# Altium footprint library HubProModel_v1.PcbLib: 67 footprints (part 2 of 5)
Each footprint in its own frame and in the unit in brackets; x right, y up, seen from the top. Pads: shape width x height; smd on the part's side, far side on the other; paste and mask are expansions set on the pad; w line width, h text height; cw(c..) or ccw(c..) is an arc to the next point about the centre after c.
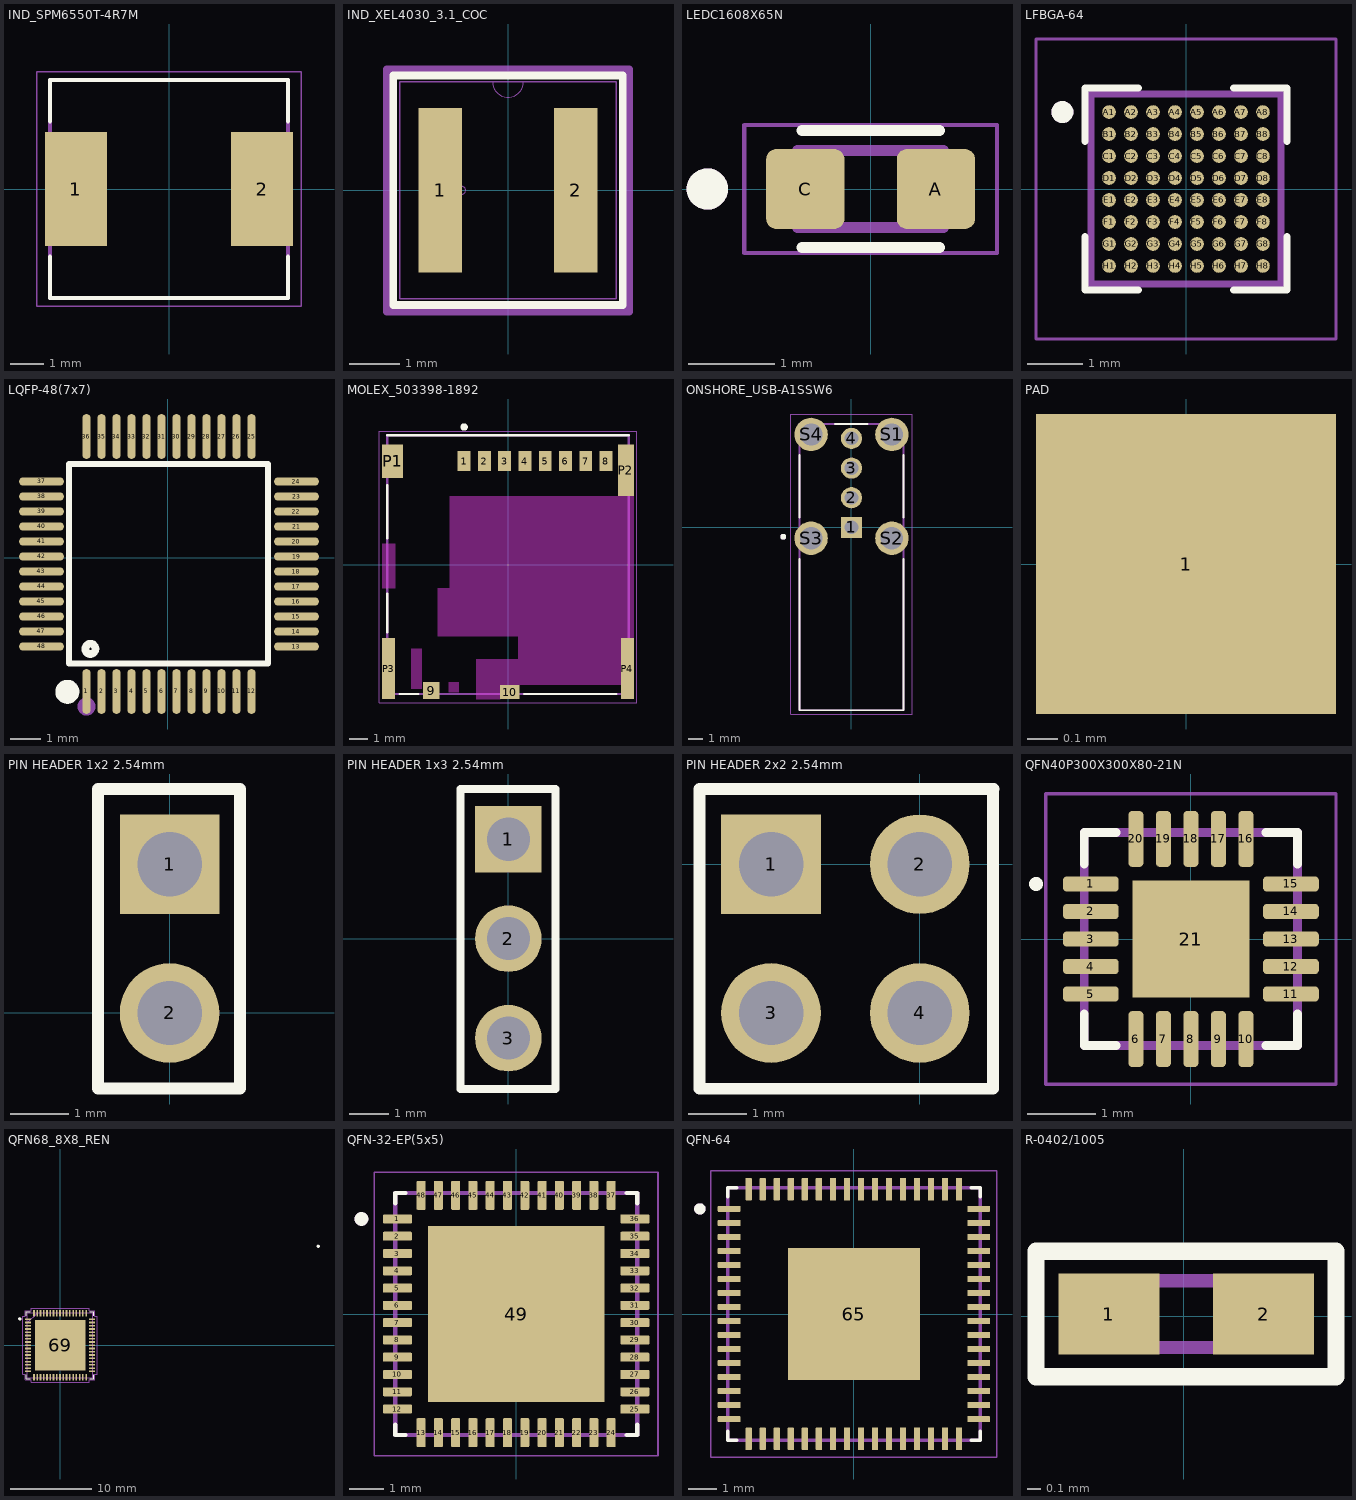
[diagram p1: the footprints below, top view; thin cyan lines are the x and y axes]

## IND_SPM6550T-4R7M [mm]
height 5
pads (2):
  rect 1.85x3.4 smd: 1(-2.775,0) 2(2.775,0)
Top Overlay:
  lines w0.127: -3.55,-2.02 -3.55,-3.25 3.55,-3.25 3.55,-2.02 ; -3.55,2.02 -3.55,3.25 3.55,3.25 3.55,2.02
Mechanical 13:
  lines w0.127: -3.55,-3.25 -3.55,3.25 3.55,3.25 3.55,-3.25 -3.55,-3.25
Mechanical 15:
  lines w0.05: -3.95,-3.5 -3.95,3.5 3.95,3.5 3.95,-3.5 -3.95,-3.5
3D body "step_temp.STEP": height 5, standoff 0, extent -3.55,-3.25 3.55,3.25

## IND_XEL4030_3.1_COC [mil]
pads (2):
  rect 34x128 smd paste+0 mask+0: 1(-53,0) 2(53,0)
Top Overlay:
  lines w6: -89.5,-89.5 89.5,-89.5 89.5,89.5 -89.5,89.5 -89.5,-89.5
Mechanical 13:
  circle w0: c-36,0 r3
  lines w0: -12,84.5 ccw(c0,84.5) 12,84.5
  lines w1: -84.5,-84.5 84.5,-84.5 84.5,84.5 -84.5,84.5 -84.5,-84.5
Mechanical 15:
  lines w6: -94.5,-94.5 -94.5,-74 -94.5,74 -94.5,94.5 94.5,94.5 94.5,74 94.5,-74 94.5,-94.5 -94.5,-94.5
3D body "IND_XEL4030_31_COC.step": height 122.09, standoff 0, extent -84.49,-84.49 84.49,84.49

## LEDC1608X65N [mm]
pads (2):
  rrect25% 0.91x0.93 smd: A(0.76,0) C(-0.76,0)
Top Overlay:
  circle w0.24: c-1.9,0 r0.12
  lines w0.127: -0.8,-0.68 0.8,-0.68 ; -0.8,0.68 0.8,0.68
Mechanical 13:
  circle w0.24: c-1.9,0 r0.12
  lines w0.127: -0.85,-0.45 0.85,-0.45 0.85,0.45 -0.85,0.45 -0.85,-0.45
Mechanical 15:
  lines w0.05: -1.47,-0.744 1.47,-0.744 1.47,0.744 -1.47,0.744 -1.47,-0.744

## LFBGA-64 [mm] "Video Converter IC GPIO, I²C, SPI HDMI 2a 64-LFBGA (7x7) Package"
pads (64):
  round 0.25 smd mask+0.05: A1(-1.4,1.4) A2(-1,1.4) A3(-0.6,1.4) A4(-0.2,1.4) A5(0.2,1.4) A6(0.6,1.4) A7(1,1.4) A8(1.4,1.4) B1(-1.4,1) B2(-1,1) B3(-0.6,1) B4(-0.2,1) B5(0.2,1) B6(0.6,1) B7(1,1) B8(1.4,1) C1(-1.4,0.6) C2(-1,0.6) C3(-0.6,0.6) C4(-0.2,0.6) C5(0.2,0.6) C6(0.6,0.6) C7(1,0.6) C8(1.4,0.6) D1(-1.4,0.2) D2(-1,0.2) D3(-0.6,0.2) D4(-0.2,0.2) D5(0.2,0.2) D6(0.6,0.2) D7(1,0.2) D8(1.4,0.2) E1(-1.4,-0.2) E2(-1,-0.2) E3(-0.6,-0.2) E4(-0.2,-0.2) E5(0.2,-0.2) E6(0.6,-0.2) E7(1,-0.2) E8(1.4,-0.2) F1(-1.4,-0.6) F2(-1,-0.6) F3(-0.6,-0.6) F4(-0.2,-0.6) F5(0.2,-0.6) F6(0.6,-0.6) F7(1,-0.6) F8(1.4,-0.6) G1(-1.4,-1) G2(-1,-1) G3(-0.6,-1) G4(-0.2,-1) G5(0.2,-1) G6(0.6,-1) G7(1,-1) G8(1.4,-1) H1(-1.4,-1.4) H2(-1,-1.4) H3(-0.6,-1.4) H4(-0.2,-1.4) H5(0.2,-1.4) H6(0.6,-1.4) H7(1,-1.4) H8(1.4,-1.4)
Top Overlay:
  circle w0.2: c-2.25,1.4 r0.1
  lines w0.127: -1.84,-0.865 -1.84,-1.84 -0.865,-1.84 ; -1.84,0.865 -1.84,1.84 -0.865,1.84 ; 0.865,-1.84 1.84,-1.84 1.84,-0.865 ; 0.865,1.84 1.84,1.84 1.84,0.865
Mechanical 13:
  circle w0.2: c-2.25,1.4 r0.1
  lines w0.127: -1.73,-1.73 1.73,-1.73 1.73,1.73 -1.73,1.73 -1.73,-1.73
Mechanical 15:
  lines w0.05: -2.73,-2.73 2.73,-2.73 2.73,2.73 -2.73,2.73 -2.73,-2.73

## LQFP-48(7x7) [mm] "LQFP-48(7x7) USB ICs ROHS"
pads (48):
  oval 0.27x1.5 smd paste+0 mask+0.05: 1(-2.703,-4.457) 2(-2.203,-4.457) 3(-1.703,-4.457) 4(-1.203,-4.457) 5(-0.703,-4.457) 6(-0.203,-4.457) 7(0.297,-4.457) 8(0.797,-4.457) 9(1.297,-4.457) 10(1.797,-4.457) 11(2.297,-4.457) 12(2.797,-4.457) 25(2.797,4.043) 26(2.297,4.043) 27(1.797,4.043) 28(1.297,4.043) 29(0.797,4.043) 30(0.297,4.043) 31(-0.203,4.043) 32(-0.703,4.043) 33(-1.203,4.043) 34(-1.703,4.043) 35(-2.203,4.043) 36(-2.703,4.043)
  oval 1.5x0.27 smd paste+0 mask+0.05: 13(4.297,-2.957) 14(4.297,-2.457) 15(4.297,-1.957) 16(4.297,-1.457) 17(4.297,-0.957) 18(4.297,-0.457) 19(4.297,0.043) 20(4.297,0.543) 21(4.297,1.043) 22(4.297,1.543) 23(4.297,2.043) 24(4.297,2.543) 37(-4.203,2.543) 38(-4.203,2.043) 39(-4.203,1.543) 40(-4.203,1.043) 41(-4.203,0.543) 42(-4.203,0.043) 43(-4.203,-0.457) 44(-4.203,-0.957) 45(-4.203,-1.457) 46(-4.203,-1.957) 47(-4.203,-2.457) 48(-4.203,-2.957)
Top Overlay:
  circle w0.254: c-2.573,-3.037 r0.17
  lines w0.2: -2.849,3.133 3.349,3.133 3.349,-3.522 -3.28,-3.522 -3.28,3.133 -2.518,3.133
  lines w0.4: -3.343,-4.267 ccw(c-3.342,-4.467) -3.34,-4.267
Mechanical 15:
  circle w0.3: c-2.703,-4.957 r0.15

## MOLEX_503398-1892 [mm] "9 (8 + 1) Position Card Connector Secure Digital - microSDâ„¢ Surface Mount, Right Angle Gold"
pads (14):
  rect 0.7x1.1 smd: 1(-2.38,5.625) 2(-1.28,5.625) 3(-0.18,5.625) 4(0.92,5.625) 5(2.02,5.625) 6(3.12,5.625) 7(4.22,5.625) 8(5.32,5.625)
  rect 0.9x0.93 smd: 9(-4.17,-6.84)
  rect 1.05x0.78 smd: 10(0.095,-6.915)
  rect 1.14x1.83 smd: P1(-6.26,5.61)
  rect 0.86x2.8 smd: P2(6.4,5.125)
  rect 0.7x3.33 smd: P3(-6.48,-5.64) P4(6.48,-5.64)
Top Overlay:
  circle w0.2: c-2.38,7.475 r0.1
  lines w0.127: -6.55,-3.675 -6.55,-1.575 ; -6.55,1.425 -6.55,4.325 ; -6.55,7.025 6.55,7.025 ; -5.876,-7.025 -4.874,-7.025 ; 0.874,-7.025 5.876,-7.025
Keep-Out Layer:
  region: 6.83,-3.975 6.13,-3.975 6.13,-6.525 -0.43,-6.525 -0.43,-7.305 -1.73,-7.305 -1.73,-5.125 0.57,-5.125 0.57,-3.875 -3.82,-3.875 -3.82,-1.275 -3.17,-1.275 -3.17,3.725 6.83,3.725
  region: -6.13,-1.276 -6.836,-1.276 -6.836,1.125 -6.13,1.125
  region: -4.685,-6.738 -5.245,-6.738 -5.245,-4.575 -4.685,-4.575
  region: -2.67,-6.93 -3.223,-6.93 -3.223,-6.375 -2.67,-6.375
Mechanical 13:
  circle w0.2: c-2.38,5.775 r0.1
  lines w0.127: -6.55,-7.025 6.55,-7.025 6.55,7.025 -6.55,7.025 -6.55,-7.025
Mechanical 15:
  lines w0.05: -7,-7.5 7,-7.5 7,7.25 -7,7.25 -7,-7.5
3D body "step_temp.STEP": height 1.4, standoff 0, extent -6.55,-7.025 6.55,7.045

## ONSHORE_USB-A1SSW6 [mm] "USB-A (USB TYPE-A) - Receptacle Connector 4 Position Through Hole, Right Angle"
height 14.6
pads (8):
  rect 1.428x1.428 / inner round 1.428 / far side rect 1.428x1.428 hole 0.92: 1(0,0)
  round 1.428 hole 0.92: 2(0,2) 3(0,4) 4(0,6)
  round 2.25 hole 1.5: S1(2.72,6.27) S2(2.72,-0.73) S3(-2.72,-0.73) S4(-2.72,6.27)
Top Overlay:
  circle w0.2: c-4.6,-0.63 r0.1
  lines w0.127: -3.5,-2.13 -3.5,-12.33 3.5,-12.33 3.5,-2.13 ; -3.5,0.67 -3.5,4.87 ; -1.1,6.97 1.1,6.97 ; 3.5,0.67 3.5,4.87
Mechanical 13:
  circle w0.2: c-4.6,-0.63 r0.1
  lines w0.127: -3.5,-12.33 -3.5,6.97 3.5,6.97 3.5,-12.33 -3.5,-12.33
Mechanical 15:
  lines w0.05: -4.095,-12.58 -4.095,7.645 4.095,7.645 4.095,-12.58 -4.095,-12.58
3D body "step_temp.STEP": height 14.45, standoff -3.9, extent -9.65,-3.6 9.65,3.6

## PAD [mm]
pads (1):
  rect 1x1 all layers, no hole paste-1 mask+0.1: 1(0,0)

## PIN HEADER 1x2 2.54mm [mm] "CONN HEADER VERT 3POS 2.54MM"
height 0.89
pads (2):
  rect 1.7x1.7 hole 1.1: 1(0,2.54)
  round 1.7 hole 1.1: 2(0,0)
Top Overlay:
  lines w0.2: -1.221,-1.289 -1.221,3.823 1.2,3.823 1.2,-1.289 -1.221,-1.289
Top Assembly:
  lines w0.1: -1.207,-1.297 -1.207,3.817 1.158,3.817 1.158,-1.297 -1.207,-1.297

## PIN HEADER 1x3 2.54mm [mm]
pads (3):
  rect 1.7x1.7 hole 1.1: 1(0,2.54)
  round 1.7 hole 1.1: 2(0,0) 3(0,-2.54)
Top Overlay:
  lines w0.2: -1.221,-3.838 1.2,-3.838 1.2,3.823 -1.221,3.823 -1.221,-3.838
Top Assembly:
  lines w0.1: -1.207,-3.838 1.158,-3.838 1.158,3.817 -1.207,3.817 -1.207,-3.838
  text "'.Designator'" at -3.223,-5.112 h1
3D body "1x3 TH Vert 100mil.STEP": height 8.38, standoff -3.3, extent -1.276,-3.819 1.264,3.801

## PIN HEADER 2x2 2.54mm [mm] "FIXED IND 22UH 620MA 350 MOHM"
height 0.89
pads (4):
  rect 1.7x1.7 hole 1.1: 1(-2.54,0)
  round 1.7 hole 1.1: 2(0,0) 3(-2.54,-2.54) 4(0,-2.54)
Top Overlay:
  lines w0.2: 1.25,1.283 1.25,-3.831 -3.761,-3.831 -3.761,1.283 1.26,1.283
Top Assembly:
  lines w0.1: 1.263,1.277 1.263,-3.837 -3.747,-3.837 -3.747,1.277 1.274,1.277
3D body "PH2-04-UA.STEP": height 8.55, standoff -3, extent -3.759,-3.811 1.241,1.269

## QFN40P300X300X80-21N [mm] "SURGE SUPP 8VC 2-CIRCUIT 20WQFN"
pads (21):
  rrect50% 0.81x0.22 smd: 1(-1.455,0.8) 2(-1.455,0.4) 3(-1.455,0) 4(-1.455,-0.4) 5(-1.455,-0.8) 11(1.455,-0.8) 12(1.455,-0.4) 13(1.455,0) 14(1.455,0.4) 15(1.455,0.8)
  rrect50% 0.22x0.81 smd: 6(-0.8,-1.455) 7(-0.4,-1.455) 8(0,-1.455) 9(0.4,-1.455) 10(0.8,-1.455) 16(0.8,1.455) 17(0.4,1.455) 18(0,1.455) 19(-0.4,1.455) 20(-0.8,1.455)
  rect 1.7x1.7 smd paste-2: 21(0,0)
Top Overlay:
  circle w0.2: c-2.25,0.8 r0.003
  lines w0.127: -1.55,-1.09 -1.55,-1.55 -1.09,-1.55 ; -1.55,1.09 -1.55,1.55 -1.09,1.55 ; 1.09,-1.55 1.55,-1.55 1.55,-1.09 ; 1.09,1.55 1.55,1.55 1.55,1.09
Top Paste:
  region: 0.538,-0.538 -0.538,-0.538 -0.538,0.538 0.538,0.538
Mechanical 13:
  circle w0.2: c-1.25,0.8 r0.003
  lines w0.127: -1.55,-1.55 -1.55,1.55 1.55,1.55 1.55,-1.55 -1.55,-1.55
Mechanical 15:
  lines w0.05: -2.11,-2.11 -2.11,2.11 2.11,2.11 2.11,-2.11 -2.11,-2.11

## QFN68_8X8_REN [mil] "USB Host Controller USB 3.0 USB Interface 68-QFN (8x8)"
pads (69):
  rect 30x8 smd paste+0 mask+0: 1(-154.5,125.98) 2(-154.5,110.24) 3(-154.5,94.49) 4(-154.5,78.74) 5(-154.5,62.99) 6(-154.5,47.24) 7(-154.5,31.5) 8(-154.5,15.75) 9(-154.5,0) 10(-154.5,-15.75) 11(-154.5,-31.5) 12(-154.5,-47.24) 13(-154.5,-62.99) 14(-154.5,-78.74) 15(-154.5,-94.49) 16(-154.5,-110.24) 17(-154.5,-125.98) 35(154.5,-125.98) 36(154.5,-110.24) 37(154.5,-94.49) 38(154.5,-78.74) 39(154.5,-62.99) 40(154.5,-47.24) 41(154.5,-31.5) 42(154.5,-15.75) 43(154.5,0) 44(154.5,15.75) 45(154.5,31.5) 46(154.5,47.24) 47(154.5,62.99) 48(154.5,78.74) 49(154.5,94.49) 50(154.5,110.24) 51(154.5,125.98)
  rect 8x30 smd paste+0 mask+0: 18(-125.98,-154.5) 19(-110.24,-154.5) 20(-94.49,-154.5) 21(-78.74,-154.5) 22(-62.99,-154.5) 23(-47.24,-154.5) 24(-31.5,-154.5) 25(-15.75,-154.5) 26(0,-154.5) 27(15.75,-154.5) 28(31.5,-154.5) 29(47.24,-154.5) 30(62.99,-154.5) 31(78.74,-154.5) 32(94.49,-154.5) 33(110.24,-154.5) 34(125.98,-154.5) 52(125.98,154.5) 53(110.24,154.5) 54(94.49,154.5) 55(78.74,154.5) 56(62.99,154.5) 57(47.24,154.5) 58(31.5,154.5) 59(15.75,154.5) 60(0,154.5) 61(-15.75,154.5) 62(-31.5,154.5) 63(-47.24,154.5) 64(-62.99,154.5) 65(-78.74,154.5) 66(-94.49,154.5) 67(-110.24,154.5) 68(-125.98,154.5)
  rect 244x244 smd paste-122 mask+0: 69(0,0)
Top Overlay:
  circle w7.87: c1245.91,477.36 r3.94
  circle w7.87: c-194.09,127.36 r3.94
  lines w6: -162.5,-143.08 -162.5,-162.5 -143.08,-162.5 ; -162.5,143.08 -162.5,162.5 -143.08,162.5 ; 143.08,-162.5 162.5,-162.5 162.5,-143.08 ; 143.08,162.5 162.5,162.5 162.5,143.08
Top Paste:
  region: -64.94,118.06 -118.06,118.06 -118.06,64.94 -64.94,64.94
  region: -64.94,57.06 -118.06,57.06 -118.06,3.94 -64.94,3.94
  region: -64.94,-3.94 -118.06,-3.94 -118.06,-57.06 -64.94,-57.06
  region: -64.94,-64.94 -118.06,-64.94 -118.06,-118.06 -64.94,-118.06
  region: -3.94,118.06 -57.06,118.06 -57.06,64.94 -3.94,64.94
  region: -3.94,57.06 -57.06,57.06 -57.06,3.94 -3.94,3.94
  region: -3.94,-3.94 -57.06,-3.94 -57.06,-57.06 -3.94,-57.06
  region: -3.94,-64.94 -57.06,-64.94 -57.06,-118.06 -3.94,-118.06
  region: 57.06,118.06 3.94,118.06 3.94,64.94 57.06,64.94
  region: 57.06,57.06 3.94,57.06 3.94,3.94 57.06,3.94
  region: 57.06,-3.94 3.94,-3.94 3.94,-57.06 57.06,-57.06
  region: 57.06,-64.94 3.94,-64.94 3.94,-118.06 57.06,-118.06
  region: 118.06,118.06 64.94,118.06 64.94,64.94 118.06,64.94
  region: 118.06,57.06 64.94,57.06 64.94,3.94 118.06,3.94
  region: 118.06,-3.94 64.94,-3.94 64.94,-57.06 118.06,-57.06
  region: 118.06,-64.94 64.94,-64.94 64.94,-118.06 118.06,-118.06
Mechanical 13:
  lines w1: -157.5,107.5 -107.5,157.5 ; -157.5,-157.5 157.5,-157.5 157.5,157.5 -157.5,157.5 -157.5,-157.5 ; -157.5,-130.98 -157.5,-120.98 -157.5,-130.98 ; -157.5,-115.24 -157.5,-105.24 -157.5,-115.24 ; -157.5,-99.49 -157.5,-89.49 -157.5,-99.49 ; -157.5,-83.74 -157.5,-73.74 -157.5,-83.74 ; -157.5,-67.99 -157.5,-57.99 -157.5,-67.99 ; -157.5,-52.24 -157.5,-42.24 -157.5,-52.24 ; -157.5,-36.5 -157.5,-26.5 -157.5,-36.5 ; -157.5,-20.75 -157.5,-10.75 -157.5,-20.75 ; -157.5,-5 -157.5,5 -157.5,-5 ; -157.5,10.75 -157.5,20.75 -157.5,10.75 ; -157.5,26.5 -157.5,36.5 -157.5,26.5 ; -157.5,42.24 -157.5,52.24 -157.5,42.24 ; -157.5,57.99 -157.5,67.99 -157.5,57.99 ; -157.5,73.74 -157.5,83.74 -157.5,73.74 ; -157.5,89.49 -157.5,99.49 -157.5,89.49 ; -157.5,105.24 -157.5,115.24 -157.5,105.24 ; -157.5,120.98 -157.5,130.98 -157.5,120.98 ; -130.98,-157.5 -120.98,-157.5 -130.98,-157.5 ; -130.98,157.5 -120.98,157.5 -130.98,157.5 ; -115.24,-157.5 -105.24,-157.5 -115.24,-157.5 ; -115.24,157.5 -105.24,157.5 -115.24,157.5 ; -99.49,-157.5 -89.49,-157.5 -99.49,-157.5 ; -99.49,157.5 -89.49,157.5 -99.49,157.5 ; -83.74,-157.5 -73.74,-157.5 -83.74,-157.5 ; -83.74,157.5 -73.74,157.5 -83.74,157.5 ; -67.99,-157.5 -57.99,-157.5 -67.99,-157.5 ; -67.99,157.5 -57.99,157.5 -67.99,157.5 ; -52.24,-157.5 -42.24,-157.5 -52.24,-157.5 ; -52.24,157.5 -42.24,157.5 -52.24,157.5 ; -36.5,-157.5 -26.5,-157.5 -36.5,-157.5 ; -36.5,157.5 -26.5,157.5 -36.5,157.5 ; -20.75,-157.5 -10.75,-157.5 -20.75,-157.5 ; -20.75,157.5 -10.75,157.5 -20.75,157.5 ; -5,-157.5 5,-157.5 -5,-157.5 ; -5,157.5 5,157.5 -5,157.5 ; 10.75,-157.5 20.75,-157.5 10.75,-157.5 ; 10.75,157.5 20.75,157.5 10.75,157.5 ; 26.5,-157.5 36.5,-157.5 26.5,-157.5 ; 26.5,157.5 36.5,157.5 26.5,157.5 ; 42.24,-157.5 52.24,-157.5 42.24,-157.5 ; 42.24,157.5 52.24,157.5 42.24,157.5 ; 57.99,-157.5 67.99,-157.5 57.99,-157.5 ; 57.99,157.5 67.99,157.5 57.99,157.5 ; 73.74,-157.5 83.74,-157.5 73.74,-157.5 ; 73.74,157.5 83.74,157.5 73.74,157.5 ; 89.49,-157.5 99.49,-157.5 89.49,-157.5 ; 89.49,157.5 99.49,157.5 89.49,157.5 ; 105.24,-157.5 115.24,-157.5 105.24,-157.5 ; 105.24,157.5 115.24,157.5 105.24,157.5 ; 120.98,-157.5 130.98,-157.5 120.98,-157.5 ; 120.98,157.5 130.98,157.5 120.98,157.5 ; 157.5,-130.98 157.5,-120.98 157.5,-130.98 ; 157.5,-115.24 157.5,-105.24 157.5,-115.24 ; 157.5,-99.49 157.5,-89.49 157.5,-99.49 ; 157.5,-83.74 157.5,-73.74 157.5,-83.74 ; 157.5,-67.99 157.5,-57.99 157.5,-67.99 ; 157.5,-52.24 157.5,-42.24 157.5,-52.24 ; 157.5,-36.5 157.5,-26.5 157.5,-36.5 ; 157.5,-20.75 157.5,-10.75 157.5,-20.75 ; 157.5,-5 157.5,5 157.5,-5 ; 157.5,10.75 157.5,20.75 157.5,10.75 ; 157.5,26.5 157.5,36.5 157.5,26.5 ; 157.5,42.24 157.5,52.24 157.5,42.24 ; 157.5,57.99 157.5,67.99 157.5,57.99 ; 157.5,73.74 157.5,83.74 157.5,73.74 ; 157.5,89.49 157.5,99.49 157.5,89.49 ; 157.5,105.24 157.5,115.24 157.5,105.24 ; 157.5,120.98 157.5,130.98 157.5,120.98
Mechanical 15:
  lines w6: -179.5,-139.98 -167.5,-139.98 -167.5,-167.5 -139.98,-167.5 -139.98,-179.5 139.98,-179.5 139.98,-167.5 167.5,-167.5 167.5,-139.98 179.5,-139.98 179.5,139.98 167.5,139.98 167.5,167.5 139.98,167.5 139.98,179.5 -139.98,179.5 -139.98,167.5 -167.5,167.5 -167.5,139.98 -179.5,139.98 -179.5,-139.98

## QFN-32-EP(5x5) [mm] "QFN-32-EP(5x5) USB ICs ROHS"
height 0.89
pads (49):
  rrect25% 0.84x0.26 smd: 1(-3.435,2.75) 2(-3.435,2.25) 3(-3.435,1.75) 4(-3.435,1.25) 5(-3.435,0.75) 6(-3.435,0.25) 7(-3.435,-0.25) 8(-3.435,-0.75) 9(-3.435,-1.25) 10(-3.435,-1.75) 11(-3.435,-2.25) 12(-3.435,-2.75) 25(3.435,-2.75) 26(3.435,-2.25) 27(3.435,-1.75) 28(3.435,-1.25) 29(3.435,-0.75) 30(3.435,-0.25) 31(3.435,0.25) 32(3.435,0.75) 33(3.435,1.25) 34(3.435,1.75) 35(3.435,2.25) 36(3.435,2.75)
  rrect25% 0.26x0.84 smd: 13(-2.75,-3.435) 14(-2.25,-3.435) 15(-1.75,-3.435) 16(-1.25,-3.435) 17(-0.75,-3.435) 18(-0.25,-3.435) 19(0.25,-3.435) 20(0.75,-3.435) 21(1.25,-3.435) 22(1.75,-3.435) 23(2.25,-3.435) 24(2.75,-3.435) 37(2.75,3.435) 38(2.25,3.435) 39(1.75,3.435) 40(1.25,3.435) 41(0.75,3.435) 42(0.25,3.435) 43(-0.25,3.435) 44(-0.75,3.435) 45(-1.25,3.435) 46(-1.75,3.435) 47(-2.25,3.435) 48(-2.75,3.435)
  rect 5.1x5.1 smd paste-4: 49(0,0)
Top Overlay:
  circle w0.2: c-4.475,2.75 r0.1
  lines w0.127: -3.5,-3.2 -3.5,-3.5 -3.2,-3.5 ; -3.5,3.2 -3.5,3.5 -3.2,3.5 ; 3.2,-3.5 3.5,-3.5 3.5,-3.2 ; 3.2,3.5 3.5,3.5 3.5,3.2
Top Paste:
  region: 2.08,-2.08 0.47,-2.08 0.47,-0.47 2.08,-0.47
  region: -0.47,-2.08 -2.08,-2.08 -2.08,-0.47 -0.47,-0.47
  region: 2.08,0.47 0.47,0.47 0.47,2.08 2.08,2.08
  region: -0.47,0.47 -2.08,0.47 -2.08,2.08 -0.47,2.08
Mechanical 13:
  circle w0.2: c-4.475,2.75 r0.1
  lines w0.127: -3.5,-3.5 -3.5,3.5 3.5,3.5 3.5,-3.5 -3.5,-3.5
Mechanical 15:
  lines w0.05: -4.105,-4.105 -4.105,4.105 4.105,4.105 4.105,-4.105 -4.105,-4.105
3D body "step_temp.STEP": height 1, standoff 0, extent -3.5,-3.5 3.5,3.5

## QFN-64 [mm] "PCI Express to 2 ports USB3.1 x HCI Host Controller"
height 1
pads (65):
  rrect25% 0.81x0.22 smd: 1(-4.45,3.75) 2(-4.45,3.25) 3(-4.45,2.75) 4(-4.45,2.25) 5(-4.45,1.75) 6(-4.45,1.25) 7(-4.45,0.75) 8(-4.45,0.25) 9(-4.45,-0.25) 10(-4.45,-0.75) 11(-4.45,-1.25) 12(-4.45,-1.75) 13(-4.45,-2.25) 14(-4.45,-2.75) 15(-4.45,-3.25) 16(-4.45,-3.75) 33(4.45,-3.75) 34(4.45,-3.25) 35(4.45,-2.75) 36(4.45,-2.25) 37(4.45,-1.75) 38(4.45,-1.25) 39(4.45,-0.75) 40(4.45,-0.25) 41(4.45,0.25) 42(4.45,0.75) 43(4.45,1.25) 44(4.45,1.75) 45(4.45,2.25) 46(4.45,2.75) 47(4.45,3.25) 48(4.45,3.75)
  rrect25% 0.22x0.81 smd: 17(-3.75,-4.45) 18(-3.25,-4.45) 19(-2.75,-4.45) 20(-2.25,-4.45) 21(-1.75,-4.45) 22(-1.25,-4.45) 23(-0.75,-4.45) 24(-0.25,-4.45) 25(0.25,-4.45) 26(0.75,-4.45) 27(1.25,-4.45) 28(1.75,-4.45) 29(2.25,-4.45) 30(2.75,-4.45) 31(3.25,-4.45) 32(3.75,-4.45) 49(3.75,4.45) 50(3.25,4.45) 51(2.75,4.45) 52(2.25,4.45) 53(1.75,4.45) 54(1.25,4.45) 55(0.75,4.45) 56(0.25,4.45) 57(-0.25,4.45) 58(-0.75,4.45) 59(-1.25,4.45) 60(-1.75,4.45) 61(-2.25,4.45) 62(-2.75,4.45) 63(-3.25,4.45) 64(-3.75,4.45)
  rect 4.7x4.7 smd paste-3: 65(0,0)
Top Overlay:
  circle w0.2: c-5.495,3.75 r0.1
  lines w0.127: -4.5,-4.18 -4.5,-4.5 -4.18,-4.5 ; -4.5,4.18 -4.5,4.5 -4.18,4.5 ; 4.18,-4.5 4.5,-4.5 4.5,-4.18 ; 4.18,4.5 4.5,4.5 4.5,4.18
Top Paste:
  region: 1.915,-1.915 0.435,-1.915 0.435,-0.435 1.915,-0.435
  region: -0.435,-1.915 -1.915,-1.915 -1.915,-0.435 -0.435,-0.435
  region: 1.915,0.435 0.435,0.435 0.435,1.915 1.915,1.915
  region: -0.435,0.435 -1.915,0.435 -1.915,1.915 -0.435,1.915
Mechanical 13:
  circle w0.2: c-5.495,3.75 r0.1
  lines w0.127: -4.5,-4.5 -4.5,4.5 4.5,4.5 4.5,-4.5 -4.5,-4.5
Mechanical 15:
  lines w0.05: -5.105,-5.105 -5.105,5.105 5.105,5.105 5.105,-5.105 -5.105,-5.105
3D body "step_temp.STEP": height 0.9, standoff 0, extent -4.5,-4.5 4.5,4.5

## R-0402/1005 [mm]
height 1.3
pads (2):
  rect 0.75x0.6 smd: 1(-0.556,0.014) 2(0.594,0.014)
Top Overlay:
  lines w0.127: -1.096,-0.451 1.13,-0.451 1.13,0.481 -1.096,0.481 -1.096,-0.451
Top Assembly:
  lines w0.1: -0.484,-0.234 0.518,-0.234 0.518,0.263 -0.484,0.263 -0.484,-0.234
  text "'.Designator'" at -3.3,-1.6 h1
3D body "0402 resistor.STEP": height 0.35, standoff 0, extent -0.482,-0.237 0.518,0.263